# Altium footprint library connectors_socets.pcblib: 567 footprints (part 2 of 36)
Each footprint in its own frame and in the unit in brackets; x right, y up, seen from the top. Pads: shape width x height; smd on the part's side, far side on the other; paste and mask are expansions set on the pad; w line width, h text height; cw(c..) or ccw(c..) is an arc to the next point about the centre after c.
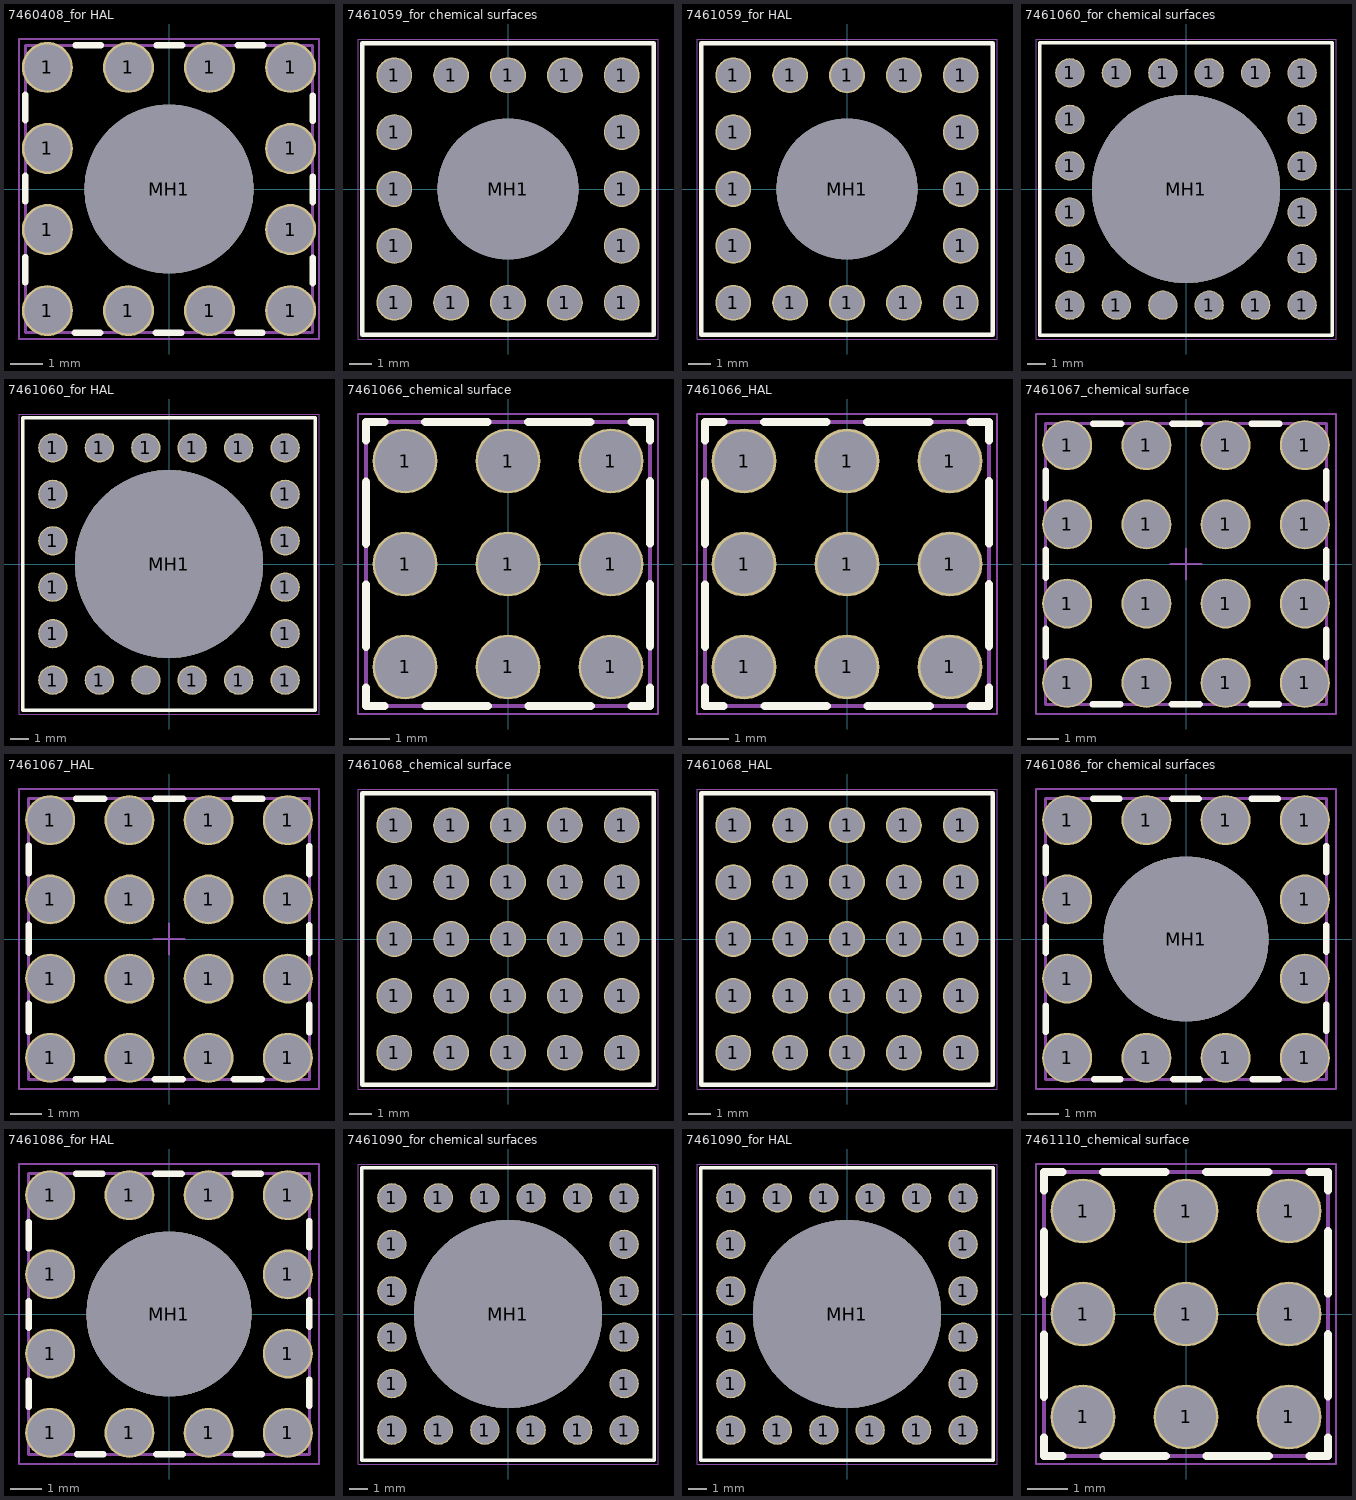
[diagram p1: the footprints below, top view; thin cyan lines are the x and y axes]

## 7460408_for HAL [mm] "M5, thr 6mm"
height 6
pads (13):
  round 1.6 hole 1.45: 1(-3.81,-3.81) 1(-3.81,-1.27) 1(-3.81,1.27) 1(-3.81,3.81) 1(-1.27,-3.81) 1(-1.27,3.81) 1(1.27,-3.81) 1(1.27,3.81) 1(3.81,-3.81) 1(3.81,-1.27) 1(3.81,1.27) 1(3.81,3.81)
  round 5.3 hole 5.3 unplated: MH1(0,0)
Top Overlay:
  lines w0.2: -4.5,-2.93 -4.5,-2.13 ; -4.5,-0.39 -4.5,0.41 ; -4.5,2.15 -4.5,2.95 ; -2.95,-4.5 -2.15,-4.5 ; -2.93,4.5 -2.13,4.5 ; -0.41,-4.5 0.39,-4.5 ; -0.39,4.5 0.41,4.5 ; 2.13,-4.5 2.93,-4.5 ; 2.15,4.5 2.95,4.5 ; 4.5,-2.95 4.5,-2.15 ; 4.5,-0.41 4.5,0.39 ; 4.5,2.13 4.5,2.93
Plata3D:
  lines w0.1: -4.5,-4.5 -4.5,4.5 4.5,4.5 4.5,-4.5 -4.5,-4.5
Board3D:
  lines w0.05: -0.5,0 0.5,0 ; 0,-0.5 0,0.5 ; -4.7,-4.7 -4.7,4.7 4.7,4.7 4.7,-4.7 -4.7,-4.7
3D body "7460408.stp": height 6, standoff -3.5, extent -4.5,-4.5 4.5,4.5

## 7461059_for chemical surfaces [mm] "M6, thr 13.5mm"
height 13.5
pads (17):
  round 1.6 hole 1.475: 1(-5.08,-5.08) 1(-5.08,-2.54) 1(-5.08,0) 1(-5.08,2.54) 1(-5.08,5.08) 1(-2.54,-5.08) 1(-2.54,5.08) 1(0,-5.08) 1(0,5.08) 1(2.54,-5.08) 1(2.54,5.08) 1(5.08,-5.08) 1(5.08,-2.54) 1(5.08,0) 1(5.08,2.54) 1(5.08,5.08)
  round 6.3 hole 6.3 unplated: MH1(0,0)
Top Overlay:
  lines w0.2: -6.5,-6.5 6.5,-6.5 6.5,6.5 -6.5,6.5 -6.5,-6.5
Plata3D:
  lines w0.1: -6.5,-6.5 -6.5,6.5 6.5,6.5 6.5,-6.5 -6.5,-6.5
Board3D:
  lines w0.05: -0.5,0 0.5,0 ; 0,-0.5 0,0.5 ; -6.7,-6.7 6.7,-6.7 6.7,6.7 -6.7,6.7 -6.7,-6.7
3D body "7461059.stp": height 13.5, standoff -3.5, extent -6.5,-6.5 6.5,6.5

## 7461059_for HAL [mm] "M6, thr 13.5mm"
height 13.5
pads (17):
  round 1.6 hole 1.45: 1(-5.08,-5.08) 1(-5.08,-2.54) 1(-5.08,0) 1(-5.08,2.54) 1(-5.08,5.08) 1(-2.54,-5.08) 1(-2.54,5.08) 1(0,-5.08) 1(0,5.08) 1(2.54,-5.08) 1(2.54,5.08) 1(5.08,-5.08) 1(5.08,-2.54) 1(5.08,0) 1(5.08,2.54) 1(5.08,5.08)
  round 6.3 hole 6.3 unplated: MH1(0,0)
Top Overlay:
  lines w0.2: -6.5,-6.5 -6.5,6.5 6.5,6.5 6.5,-6.5 -6.5,-6.5
Plata3D:
  lines w0.1: -6.5,-6.5 6.5,-6.5 6.5,6.5 -6.5,6.5 -6.5,-6.5
Board3D:
  lines w0.05: -0.5,0 0.5,0 ; 0,-0.5 0,0.5 ; -6.7,-6.7 -6.7,6.7 6.7,6.7 6.7,-6.7 -6.7,-6.7
3D body "7461059.stp": height 13.5, standoff -3.5, extent -6.5,-6.5 6.5,6.5

## 7461060_for chemical surfaces [mm] "M10, thr 17.5mm"
height 17.5
pads (21):
  round 1.6 hole 1.475: 1(-6.35,-6.35) 1(-6.35,-3.81) 1(-6.35,-1.27) 1(-6.35,1.27) 1(-6.35,3.81) 1(-6.35,6.35) 1(-3.81,-6.35) 1(-3.81,6.35) 1(-1.27,6.35) 1(1.27,-6.35) 1(1.27,6.35) 1(3.81,-6.35) 1(3.81,6.35) 1(6.35,-6.35) 1(6.35,-3.81) 1(6.35,-1.27) 1(6.35,1.27) 1(6.35,3.81) 1(6.35,6.35) ""(-1.27,-6.35)
  round 10.3 hole 10.3 unplated: MH1(0,0)
Top Overlay:
  lines w0.2: -8,-8 -8,8 8,8 8,-8 -8,-8
Plata3D:
  lines w0.1: -8,-8 8,-8 8,8 -8,8 -8,-8
Board3D:
  lines w0.05: -0.5,0 0.5,0 ; 0,-0.5 0,0.5 ; -8.2,-8.2 8.2,-8.2 8.2,8.2 -8.2,8.2 -8.2,-8.2
3D body "7461060.stp": height 17.5, standoff -3.5, extent -8,-8 8,8

## 7461060_for HAL [mm] "M10, thr 17.5mm"
height 17.5
pads (21):
  round 1.6 hole 1.45: 1(-6.35,-6.35) 1(-6.35,-3.81) 1(-6.35,-1.27) 1(-6.35,1.27) 1(-6.35,3.81) 1(-6.35,6.35) 1(-3.81,-6.35) 1(-3.81,6.35) 1(-1.27,6.35) 1(1.27,-6.35) 1(1.27,6.35) 1(3.81,-6.35) 1(3.81,6.35) 1(6.35,-6.35) 1(6.35,-3.81) 1(6.35,-1.27) 1(6.35,1.27) 1(6.35,3.81) 1(6.35,6.35) ""(-1.27,-6.35)
  round 10.3 hole 10.3 unplated: MH1(0,0)
Top Overlay:
  lines w0.2: -8,-8 8,-8 8,8 -8,8 -8,-8
Plata3D:
  lines w0.1: -8,-8 -8,8 8,8 8,-8 -8,-8
Board3D:
  lines w0.05: -0.5,0 0.5,0 ; 0,-0.5 0,0.5 ; -8.2,-8.2 -8.2,8.2 8.2,8.2 8.2,-8.2 -8.2,-8.2
3D body "7461060.stp": height 17.5, standoff -3.5, extent -8,-8 8,8

## 7461066_chemical surface [mm] "M3, thr 4mm"
height 14
pads (9):
  round 1.6 hole 1.475: 1(-2.54,-2.54) 1(-2.54,0) 1(-2.54,2.54) 1(0,-2.54) 1(0,0) 1(0,2.54) 1(2.54,-2.54) 1(2.54,0) 1(2.54,2.54)
Top Overlay:
  lines w0.2: -3.5,-3.05 -3.5,-3.5 -3.05,-3.5 ; -3.5,-2.04 -3.5,-0.51 ; -3.5,0.5 -3.5,2.03 ; -3.5,3.05 -3.5,3.5 -3.05,3.5 ; -2.04,3.5 -0.51,3.5 ; -2.03,-3.5 -0.5,-3.5 ; 0.5,3.5 2.03,3.5 ; 0.51,-3.5 2.04,-3.5 ; 3.05,-3.5 3.5,-3.5 3.5,-3.05 ; 3.05,3.5 3.5,3.5 3.5,3.05 ; 3.5,-2.03 3.5,-0.5 ; 3.5,0.51 3.5,2.04
Mechanical 11:
  lines w0.1: -3.5,-3.5 3.5,-3.5 3.5,3.5 -3.5,3.5 -3.5,-3.5
  text ".Designator" at -1.75,-0.75 h1.5
Plata3D:
  lines w0.1: -3.5,-3.5 3.5,-3.5 3.5,3.5 -3.5,3.5 -3.5,-3.5
Board3D:
  lines w0.05: -0.5,0 0.5,0 ; 0,-0.5 0,0.5 ; -3.7,-3.7 -3.7,3.7 3.7,3.7 3.7,-3.7 -3.7,-3.7
3D body "7461066.stp": height 14, standoff -3.5, extent -3.5,-3.5 3.5,3.5

## 7461066_HAL [mm] "M3, thr 4mm"
height 14
pads (9):
  round 1.6 hole 1.45: 1(-2.54,-2.54) 1(-2.54,0) 1(-2.54,2.54) 1(0,-2.54) 1(0,0) 1(0,2.54) 1(2.54,-2.54) 1(2.54,0) 1(2.54,2.54)
Top Overlay:
  lines w0.2: -3.5,-3.05 -3.5,-3.5 -3.05,-3.5 ; -3.5,-2.04 -3.5,-0.51 ; -3.5,0.5 -3.5,2.03 ; -3.5,3.05 -3.5,3.5 -3.05,3.5 ; -2.04,3.5 -0.51,3.5 ; -2.03,-3.5 -0.5,-3.5 ; 0.5,3.5 2.03,3.5 ; 0.51,-3.5 2.04,-3.5 ; 3.05,-3.5 3.5,-3.5 3.5,-3.05 ; 3.05,3.5 3.5,3.5 3.5,3.05 ; 3.5,-2.03 3.5,-0.5 ; 3.5,0.51 3.5,2.04
Mechanical 11:
  lines w0.1: -3.5,-3.5 3.5,-3.5 3.5,3.5 -3.5,3.5 -3.5,-3.5
  text ".Designator" at -1.75,-0.75 h1.5
Plata3D:
  lines w0.1: -3.5,-3.5 -3.5,3.5 3.5,3.5 3.5,-3.5 -3.5,-3.5
Board3D:
  lines w0.05: -0.5,0 0.5,0 ; 0,-0.5 0,0.5 ; -3.7,-3.7 -3.7,3.7 3.7,3.7 3.7,-3.7 -3.7,-3.7
3D body "7461066.stp": height 14, standoff -3.5, extent -3.5,-3.5 3.5,3.5

## 7461067_chemical surface [mm] "ID4.2mm, thr 5mm"
height 14
pads (16):
  round 1.6 hole 1.475: 1(-3.81,-3.81) 1(-3.81,-1.27) 1(-3.81,1.27) 1(-3.81,3.81) 1(-1.27,-3.81) 1(-1.27,-1.27) 1(-1.27,1.27) 1(-1.27,3.81) 1(1.27,-3.81) 1(1.27,-1.27) 1(1.27,1.27) 1(1.27,3.81) 1(3.81,-3.81) 1(3.81,-1.27) 1(3.81,1.27) 1(3.81,3.81)
Top Overlay:
  lines w0.2: -4.5,-2.98 -4.5,-2.08 ; -4.5,-0.44 -4.5,0.46 ; -4.5,2.1 -4.5,3 ; -3,-4.5 -2.1,-4.5 ; -2.98,4.5 -2.08,4.5 ; -0.46,-4.5 0.44,-4.5 ; -0.44,4.5 0.46,4.5 ; 2.08,-4.5 2.98,-4.5 ; 2.1,4.5 3,4.5 ; 4.5,-3 4.5,-2.1 ; 4.5,-0.46 4.5,0.44 ; 4.5,2.08 4.5,2.98
Mechanical 11:
  lines w0.1: -4.5,-4.5 4.5,-4.5 4.5,4.5 -4.5,4.5 -4.5,-4.5
  text ".Designator" at -1.75,-0.75 h1.5
Plata3D:
  lines w0.1: -4.5,-4.5 -4.5,4.5 4.5,4.5 4.5,-4.5 -4.5,-4.5
Board3D:
  lines w0.05: -0.5,0 0.5,0 ; 0,-0.5 0,0.5 ; -4.81,-4.81 -4.81,4.81 4.81,4.81 4.81,-4.81 -4.81,-4.81
3D body "7461067.stp": height 14, standoff -3.5, extent -4.5,-4.5 4.5,4.5

## 7461067_HAL [mm] "ID4.2mm, thr 5mm"
height 14
pads (16):
  round 1.6 hole 1.45: 1(-3.81,-3.81) 1(-3.81,-1.27) 1(-3.81,1.27) 1(-3.81,3.81) 1(-1.27,-3.81) 1(-1.27,-1.27) 1(-1.27,1.27) 1(-1.27,3.81) 1(1.27,-3.81) 1(1.27,-1.27) 1(1.27,1.27) 1(1.27,3.81) 1(3.81,-3.81) 1(3.81,-1.27) 1(3.81,1.27) 1(3.81,3.81)
Top Overlay:
  lines w0.2: -4.5,-2.98 -4.5,-2.08 ; -4.5,-0.44 -4.5,0.46 ; -4.5,2.1 -4.5,3 ; -3,-4.5 -2.1,-4.5 ; -2.98,4.5 -2.08,4.5 ; -0.46,-4.5 0.44,-4.5 ; -0.44,4.5 0.46,4.5 ; 2.08,-4.5 2.98,-4.5 ; 2.1,4.5 3,4.5 ; 4.5,-3 4.5,-2.1 ; 4.5,-0.46 4.5,0.44 ; 4.5,2.08 4.5,2.98
Mechanical 11:
  lines w0.1: -4.5,-4.5 4.5,-4.5 4.5,4.5 -4.5,4.5 -4.5,-4.5
  text ".Designator" at -1.75,-0.75 h1.5
Plata3D:
  lines w0.1: -4.5,-4.5 4.5,-4.5 4.5,4.5 -4.5,4.5 -4.5,-4.5
Board3D:
  lines w0.05: -0.5,0 0.5,0 ; 0,-0.5 0,0.5 ; -4.81,-4.81 -4.81,4.81 4.81,4.81 4.81,-4.81 -4.81,-4.81
3D body "7461067.stp": height 14, standoff -3.5, extent -4.5,-4.5 4.5,4.5

## 7461068_chemical surface [mm] "M8, thr 8mm"
height 20
pads (25):
  round 1.6 hole 1.475: 1(-5.08,-5.08) 1(-5.08,-2.54) 1(-5.08,0) 1(-5.08,2.54) 1(-5.08,5.08) 1(-2.54,-5.08) 1(-2.54,-2.54) 1(-2.54,0) 1(-2.54,2.54) 1(-2.54,5.08) 1(0,-5.08) 1(0,-2.54) 1(0,0) 1(0,2.54) 1(0,5.08) 1(2.54,-5.08) 1(2.54,-2.54) 1(2.54,0) 1(2.54,2.54) 1(2.54,5.08) 1(5.08,-5.08) 1(5.08,-2.54) 1(5.08,0) 1(5.08,2.54) 1(5.08,5.08)
Top Overlay:
  lines w0.2: -6.5,-6.5 6.5,-6.5 6.5,6.5 -6.5,6.5 -6.5,-6.5
Mechanical 11:
  lines w0.1: -6.5,-6.5 -6.5,6.5 6.5,6.5 6.5,-6.5 -6.5,-6.5
  text ".Designator" at -1.75,-0.75 h1.5
Plata3D:
  lines w0.1: -6.5,-6.5 6.5,-6.5 6.5,6.5 -6.5,6.5 -6.5,-6.5
Board3D:
  lines w0.05: -0.5,0 0.5,0 ; 0,-0.5 0,0.5 ; -6.7,-6.7 6.7,-6.7 6.7,6.7 -6.7,6.7 -6.7,-6.7
3D body "7461068.stp": height 20, standoff -3.5, extent -6.5,-6.5 6.5,6.5

## 7461068_HAL [mm] "M8, thr 8mm"
height 20
pads (25):
  round 1.6 hole 1.45: 1(-5.08,-5.08) 1(-5.08,-2.54) 1(-5.08,0) 1(-5.08,2.54) 1(-5.08,5.08) 1(-2.54,-5.08) 1(-2.54,-2.54) 1(-2.54,0) 1(-2.54,2.54) 1(-2.54,5.08) 1(0,-5.08) 1(0,-2.54) 1(0,0) 1(0,2.54) 1(0,5.08) 1(2.54,-5.08) 1(2.54,-2.54) 1(2.54,0) 1(2.54,2.54) 1(2.54,5.08) 1(5.08,-5.08) 1(5.08,-2.54) 1(5.08,0) 1(5.08,2.54) 1(5.08,5.08)
Top Overlay:
  lines w0.2: -6.5,-6.5 -6.5,6.5 6.5,6.5 6.5,-6.5 -6.5,-6.5
Mechanical 11:
  lines w0.1: -6.5,-6.5 -6.5,6.5 6.5,6.5 6.5,-6.5 -6.5,-6.5
  text ".Designator" at -1.75,-0.75 h1.5
Plata3D:
  lines w0.1: -6.5,-6.5 6.5,-6.5 6.5,6.5 -6.5,6.5 -6.5,-6.5
Board3D:
  lines w0.05: -0.5,0 0.5,0 ; 0,-0.5 0,0.5 ; -6.7,-6.7 -6.7,6.7 6.7,6.7 6.7,-6.7 -6.7,-6.7
3D body "7461068.stp": height 20, standoff -3.5, extent -6.5,-6.5 6.5,6.5

## 7461086_for chemical surfaces [mm] "M4, thr 6mm"
height 6
pads (13):
  round 1.6 hole 1.475: 1(-3.81,-3.81) 1(-3.81,-1.27) 1(-3.81,1.27) 1(-3.81,3.81) 1(-1.27,-3.81) 1(-1.27,3.81) 1(1.27,-3.81) 1(1.27,3.81) 1(3.81,-3.81) 1(3.81,-1.27) 1(3.81,1.27) 1(3.81,3.81)
  round 5.3 hole 5.3 unplated: MH1(0,0)
Top Overlay:
  lines w0.2: -4.5,-2.98 -4.5,-2.13 ; -4.5,-0.44 -4.5,0.41 ; -4.5,2.1 -4.5,2.95 ; -2.98,4.5 -2.13,4.5 ; -2.95,-4.5 -2.1,-4.5 ; -0.44,4.5 0.41,4.5 ; -0.41,-4.5 0.44,-4.5 ; 2.1,4.5 2.95,4.5 ; 2.13,-4.5 2.98,-4.5 ; 4.5,-2.95 4.5,-2.1 ; 4.5,-0.41 4.5,0.44 ; 4.5,2.13 4.5,2.98
Plata3D:
  lines w0.1: -4.5,-4.5 4.5,-4.5 4.5,4.5 -4.5,4.5 -4.5,-4.5
Board3D:
  lines w0.05: -0.5,0 0.5,0 ; 0,-0.5 0,0.5 ; -4.81,-4.81 4.81,-4.81 4.81,4.81 -4.81,4.81 -4.81,-4.81
3D body "7461086.stp": height 6, standoff -3.5, extent -4.5,-4.5 4.5,4.5

## 7461086_for HAL [mm] "M4, thr 6mm"
height 6
pads (13):
  round 1.6 hole 1.45: 1(-3.81,-3.81) 1(-3.81,-1.27) 1(-3.81,1.27) 1(-3.81,3.81) 1(-1.27,-3.81) 1(-1.27,3.81) 1(1.27,-3.81) 1(1.27,3.81) 1(3.81,-3.81) 1(3.81,-1.27) 1(3.81,1.27) 1(3.81,3.81)
  round 5.3 hole 5.3 unplated: MH1(0,0)
Top Overlay:
  lines w0.2: -4.5,-2.98 -4.5,-2.13 ; -4.5,-0.44 -4.5,0.41 ; -4.5,2.1 -4.5,2.95 ; -2.98,4.5 -2.13,4.5 ; -2.95,-4.5 -2.1,-4.5 ; -0.44,4.5 0.41,4.5 ; -0.41,-4.5 0.44,-4.5 ; 2.1,4.5 2.95,4.5 ; 2.13,-4.5 2.98,-4.5 ; 4.5,-2.95 4.5,-2.1 ; 4.5,-0.41 4.5,0.44 ; 4.5,2.13 4.5,2.98
Plata3D:
  lines w0.1: -4.5,-4.5 -4.5,4.5 4.5,4.5 4.5,-4.5 -4.5,-4.5
Board3D:
  lines w0.05: -0.5,0 0.5,0 ; 0,-0.5 0,0.5 ; -4.81,-4.81 -4.81,4.81 4.81,4.81 4.81,-4.81 -4.81,-4.81
3D body "7461086.stp": height 6, standoff -3.5, extent -4.5,-4.5 4.5,4.5

## 7461090_for chemical surfaces [mm] "M8, thr 13.5mm"
height 13.5
pads (21):
  round 1.6 hole 1.475: 1(-6.35,-6.35) 1(-6.35,-3.81) 1(-6.35,-1.27) 1(-6.35,1.27) 1(-6.35,3.81) 1(-6.35,6.35) 1(-3.81,-6.35) 1(-3.81,6.35) 1(-1.27,-6.35) 1(-1.27,6.35) 1(1.27,-6.35) 1(1.27,6.35) 1(3.81,-6.35) 1(3.81,6.35) 1(6.35,-6.35) 1(6.35,-3.81) 1(6.35,-1.27) 1(6.35,1.27) 1(6.35,3.81) 1(6.35,6.35)
  round 10.3 hole 10.3 unplated: MH1(0,0)
Top Overlay:
  lines w0.2: -8,-8 8,-8 8,8 -8,8 -8,-8
Plata3D:
  lines w0.1: -8,-8 -8,8 8,8 8,-8 -8,-8
Board3D:
  lines w0.05: -0.5,0 0.5,0 ; 0,-0.5 0,0.5 ; -8.2,-8.2 8.2,-8.2 8.2,8.2 -8.2,8.2 -8.2,-8.2
3D body "7461090.stp": height 13.5, standoff -3.5, extent -8,-8 8,8

## 7461090_for HAL [mm] "M8, thr 13.5mm"
height 13.5
pads (21):
  round 1.6 hole 1.45: 1(-6.35,-6.35) 1(-6.35,-3.81) 1(-6.35,-1.27) 1(-6.35,1.27) 1(-6.35,3.81) 1(-6.35,6.35) 1(-3.81,-6.35) 1(-3.81,6.35) 1(-1.27,-6.35) 1(-1.27,6.35) 1(1.27,-6.35) 1(1.27,6.35) 1(3.81,-6.35) 1(3.81,6.35) 1(6.35,-6.35) 1(6.35,-3.81) 1(6.35,-1.27) 1(6.35,1.27) 1(6.35,3.81) 1(6.35,6.35)
  round 10.3 hole 10.3 unplated: MH1(0,0)
Top Overlay:
  lines w0.2: -8,-8 8,-8 8,8 -8,8 -8,-8
Plata3D:
  lines w0.1: -8,-8 -8,8 8,8 8,-8 -8,-8
Board3D:
  lines w0.05: -0.5,0 0.5,0 ; 0,-0.5 0,0.5 ; -8.2,-8.2 8.2,-8.2 8.2,8.2 -8.2,8.2 -8.2,-8.2
3D body "7461090.stp": height 13.5, standoff -3.5, extent -8,-8 8,8

## 7461110_chemical surface [mm] "ID3.2mm, thrh 4mm"
height 14
pads (9):
  round 1.6 hole 1.475: 1(-2.54,-2.54) 1(-2.54,0) 1(-2.54,2.54) 1(0,-2.54) 1(0,0) 1(0,2.54) 1(2.54,-2.54) 1(2.54,0) 1(2.54,2.54)
Top Overlay:
  lines w0.2: -3.5,-3.05 -3.5,-3.5 -3.05,-3.5 ; -3.5,-2.04 -3.5,-0.51 ; -3.5,0.5 -3.5,2.03 ; -3.5,3.05 -3.5,3.5 -3.05,3.5 ; -2.04,3.5 -0.51,3.5 ; -2.03,-3.5 -0.5,-3.5 ; 0.5,3.5 2.03,3.5 ; 0.51,-3.5 2.04,-3.5 ; 3.05,-3.5 3.5,-3.5 3.5,-3.05 ; 3.05,3.5 3.5,3.5 3.5,3.05 ; 3.5,-2.03 3.5,-0.5 ; 3.5,0.51 3.5,2.04
Mechanical 11:
  lines w0.1: -3.5,-3.5 3.5,-3.5 3.5,3.5 -3.5,3.5 -3.5,-3.5
  text ".Designator" at -1.75,-0.75 h1.5
Plata3D:
  lines w0.1: -3.5,-3.5 -3.5,3.5 3.5,3.5 3.5,-3.5 -3.5,-3.5
Board3D:
  lines w0.05: -0.5,0 0.5,0 ; 0,-0.5 0,0.5 ; -3.7,-3.7 3.7,-3.7 3.7,3.7 -3.7,3.7 -3.7,-3.7
3D body "7461110.stp": height 14, standoff -3.5, extent -3.5,-3.5 3.5,3.5